# Altium footprint library Connectors.PCBLIB: 109 footprints (part 5 of 7)
Each footprint in its own frame and in the unit in brackets; x right, y up, seen from the top. Pads: shape width x height; smd on the part's side, far side on the other; paste and mask are expansions set on the pad; w line width, h text height; cw(c..) or ccw(c..) is an arc to the next point about the centre after c.
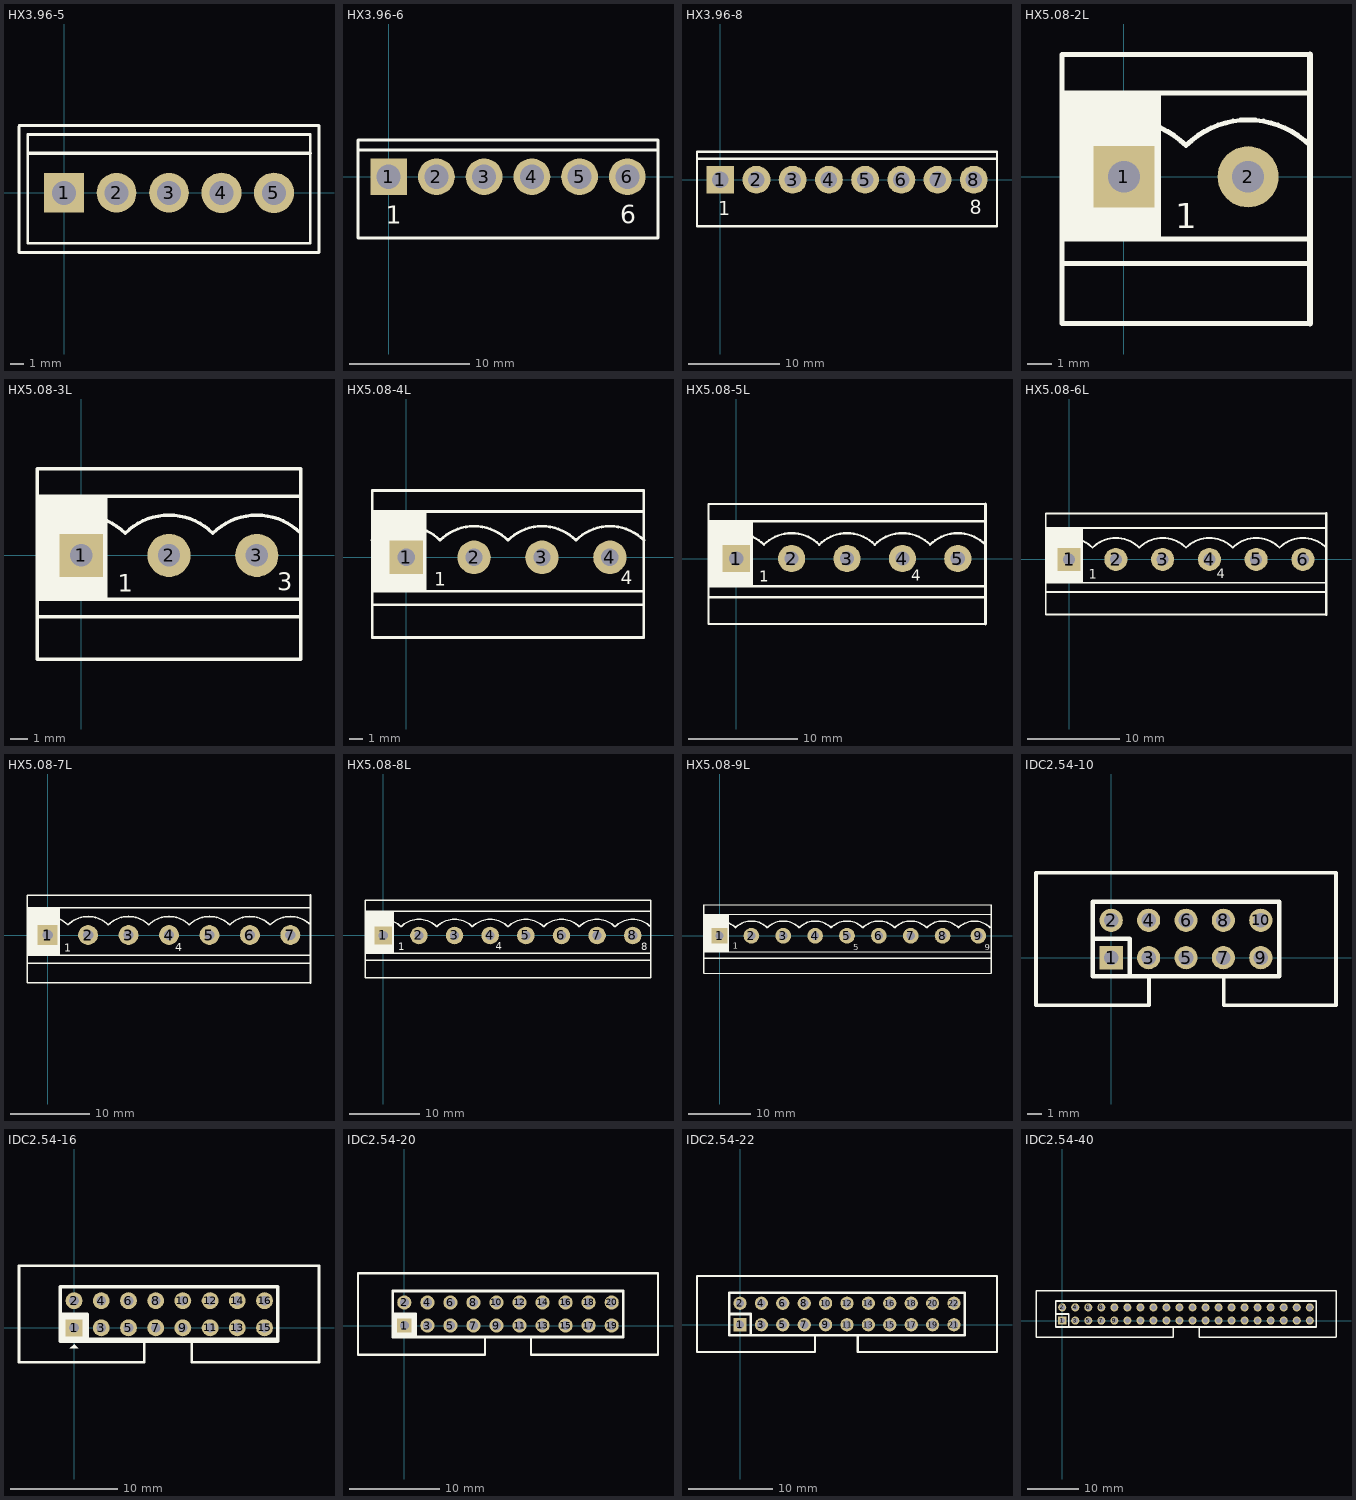
[diagram p4: the footprints below, top view; thin cyan lines are the x and y axes]

## HX3.96-5 [mm]
pads (5):
  rect 3x3 hole 1.8: 1(0,0)
  round 3 hole 1.8: 2(3.96,0) 3(7.92,0)
  round 3.048 hole 1.8: 4(11.88,0) 5(15.84,0)
Top Overlay:
  lines w0.203: -3.4,-4.5 -3.4,5 ; -3.387,5.08 19.24,5.08 19.24,-4.445 ; -3.3,-4.5 19.24,-4.5 ; -2.75,-3.8 -2.75,4.4 18.59,4.4 18.59,-3.8 -2.75,-3.8
  lines w0.254: -2.7,3 18.59,3

## HX3.96-6 [mil]
pads (6):
  rect 120x120 hole 78.74: 1(0,0)
  round 120 hole 78.74: 2(155.91,0) 3(311.81,0) 4(467.72,0) 5(623.62,0) 6(779.53,0)
Top Overlay:
  lines w10: -100,88 879.53,88 ; -100,-200 879.53,-200 879.53,120 -100,120 -100,-200
  text "1" at -10,-153 h60
  text "6" at 757,-152 h60

## HX3.96-8 [mil]
pads (8):
  rect 120x120 hole 70.87: 1(0,0)
  round 120 hole 70.87: 2(155.91,0) 3(311.81,0) 4(467.72,0) 5(623.62,0) 6(779.53,0) 7(935.43,0) 8(1091.34,0)
Top Overlay:
  lines w10: -100,90 1191.34,90 ; -100,-200 -100,120 1191.34,120 1191.34,-200 -100,-200
  text "1" at -9,-152 h60
  text "8" at 1075,-149 h60

## HX5.08-2L [mm]
pads (2):
  rect 2.5x2.5 hole 1.3: 1(0,0)
  round 2.5 hole 1.3: 2(5.08,0)
Top Overlay:
  rectangle: -2.54,-2.54 1.524,3.429
  lines w0.203: -2.544,1.274 cw(c0,-1.27) 2.544,1.274 ; -2.54,-3.556 7.62,-3.556 ; -2.54,-2.54 7.62,-2.54 ; -2.54,3.429 7.62,3.429 ; 2.536,1.274 cw(c5.08,-1.27) 7.624,1.274 ; 7.62,-6 -2.54,-6 -2.54,5 7.62,5
  lines w0.254: 7.62,-6 7.62,5
  text "1" at 2.108,-2.108 h1.02
3D body "050-2.step": height 11, standoff -2, extent -2.5,-5.5 7.5,2.5

## HX5.08-3L [mm]
pads (3):
  rect 2.5x2.5 hole 1.3: 1(0,0)
  round 2.5 hole 1.3: 2(5.08,0) 3(10.16,0)
Top Overlay:
  rectangle: -2.54,-2.54 1.524,3.429
  lines w0.203: -2.544,1.274 cw(c0,-1.27) 2.544,1.274 ; -2.54,-3.556 12.7,-3.556 ; -2.54,-2.54 12.7,-2.54 ; -2.54,3.429 12.7,3.429 ; 2.536,1.274 cw(c5.08,-1.27) 7.624,1.274 ; 7.616,1.274 cw(c10.16,-1.27) 12.704,1.274 ; -2.54,-6 -2.54,5 12.7,5 12.7,-6 -2.54,-6
  text "1" at 2.108,-2.108 h1.02
  text "3" at 11.328,-2.032 h1.02
3D body "050-3.step": height 11, standoff -2, extent -2.5,-5.5 12.5,2.5

## HX5.08-4L [mm]
pads (4):
  rect 2.5x2.5 hole 1.3: 1(0,0)
  round 2.5 hole 1.3: 2(5.08,0) 3(10.16,0) 4(15.24,0)
Top Overlay:
  rectangle: -2.54,-2.54 1.524,3.429
  lines w0.203: -2.544,1.274 cw(c0,-1.27) 2.544,1.274 ; -2.54,-3.556 17.78,-3.556 ; -2.54,-2.54 17.78,-2.54 ; -2.54,3.429 17.78,3.429 ; 2.536,1.274 cw(c5.08,-1.27) 7.624,1.274 ; 7.616,1.274 cw(c10.16,-1.27) 12.704,1.274 ; 12.696,1.274 cw(c15.24,-1.27) 17.784,1.274 ; -2.54,-6 17.78,-6 17.78,5 -2.54,5 -2.54,-6
  text "4" at 16.053,-2.032 h1.02
  text "1" at 2.108,-2.108 h1.02
3D body "050-4.step": height 11, standoff -2, extent -2.5,-5.5 17.5,2.5

## HX5.08-5L [mm]
pads (5):
  rect 2.5x2.5 hole 1.3: 1(0,0)
  round 2.5 hole 1.3: 2(5.08,0) 3(10.16,0) 4(15.24,0) 5(20.32,0)
Top Overlay:
  rectangle: -2.54,-2.54 1.524,3.429
  lines w0.203: -2.544,1.274 cw(c0,-1.27) 2.544,1.274 ; -2.54,-3.556 22.86,-3.556 ; -2.54,-2.54 22.86,-2.54 ; -2.54,3.429 22.86,3.429 ; 2.536,1.274 cw(c5.08,-1.27) 7.624,1.274 ; 7.616,1.274 cw(c10.16,-1.27) 12.704,1.274 ; 12.696,1.274 cw(c15.24,-1.27) 17.784,1.274 ; 17.776,1.274 cw(c20.32,-1.27) 22.864,1.274 ; 22.86,-6 -2.54,-6 -2.54,5 22.86,5
  lines w0.254: 22.86,-6 22.86,5
  text "1" at 2.108,-2.108 h1.02
  text "4" at 16.053,-2.032 h1.02
3D body "050-5.step": height 11, standoff -2, extent -2.5,-5.5 22.5,2.5

## HX5.08-6L [mm]
pads (6):
  rect 2.5x2.5 hole 1.3: 1(0,0)
  round 2.5 hole 1.3: 2(5.08,0) 3(10.16,0) 4(15.24,0) 5(20.32,0) 6(25.4,0)
Top Overlay:
  rectangle: -2.54,-2.54 1.524,3.429
  lines w0.203: -2.544,1.274 cw(c0,-1.27) 2.544,1.274 ; -2.54,-3.556 27.94,-3.556 ; -2.54,-2.54 27.94,-2.54 ; -2.54,3.429 27.94,3.429 ; 2.536,1.274 cw(c5.08,-1.27) 7.624,1.274 ; 7.616,1.274 cw(c10.16,-1.27) 12.704,1.274 ; 12.696,1.274 cw(c15.24,-1.27) 17.784,1.274 ; 17.776,1.274 cw(c20.32,-1.27) 22.864,1.274 ; 22.856,1.274 cw(c25.4,-1.27) 27.944,1.274 ; 27.94,-6 -2.54,-6 -2.54,5 27.94,5
  lines w0.254: 27.94,-6 27.94,5
  text "1" at 2.108,-2.108 h1.02
  text "4" at 16.053,-2.032 h1.02
3D body "050-6.step": height 11, standoff -2, extent -2.5,-5.5 27.5,2.5

## HX5.08-7L [mm]
pads (7):
  rect 2.5x2.5 hole 1.3: 1(0,0)
  round 2.5 hole 1.3: 2(5.08,0) 3(10.16,0) 4(15.24,0) 5(20.32,0) 6(25.4,0) 7(30.48,0)
Top Overlay:
  rectangle: -2.54,-2.54 1.524,3.429
  lines w0.203: -2.544,1.274 cw(c0,-1.27) 2.544,1.274 ; -2.54,-3.556 33.02,-3.556 ; -2.54,-2.54 33.02,-2.54 ; -2.54,3.429 33.02,3.429 ; 2.536,1.274 cw(c5.08,-1.27) 7.624,1.274 ; 7.616,1.274 cw(c10.16,-1.27) 12.704,1.274 ; 12.696,1.274 cw(c15.24,-1.27) 17.784,1.274 ; 17.776,1.274 cw(c20.32,-1.27) 22.864,1.274 ; 22.856,1.274 cw(c25.4,-1.27) 27.944,1.274 ; 27.936,1.274 cw(c30.48,-1.27) 33.024,1.274 ; 33.02,-6 -2.54,-6 -2.54,5 33.02,5
  lines w0.254: 33.02,-6 33.02,5
  text "1" at 2.108,-2.108 h1.02
  text "4" at 16.053,-2.032 h1.02
3D body "050-7.step": height 11, standoff -2, extent -2.5,-5.5 32.5,2.5

## HX5.08-8L [mm]
pads (8):
  rect 2.5x2.5 hole 1.3: 1(0,0)
  round 2.5 hole 1.3: 2(5.08,0) 3(10.16,0) 4(15.24,0) 5(20.32,0) 6(25.4,0) 7(30.48,0) 8(35.56,0)
Top Overlay:
  rectangle: -2.54,-2.54 1.524,3.429
  lines w0.203: -2.544,1.274 cw(c0,-1.27) 2.544,1.274 ; -2.54,-3.556 38.1,-3.556 ; -2.54,-2.54 38.1,-2.54 ; -2.54,3.429 38.1,3.429 ; 2.536,1.274 cw(c5.08,-1.27) 7.624,1.274 ; 7.616,1.274 cw(c10.16,-1.27) 12.704,1.274 ; 12.696,1.274 cw(c15.24,-1.27) 17.784,1.274 ; 17.776,1.274 cw(c20.32,-1.27) 22.864,1.274 ; 22.856,1.274 cw(c25.4,-1.27) 27.944,1.274 ; 27.936,1.274 cw(c30.48,-1.27) 33.024,1.274 ; 33.016,1.274 cw(c35.56,-1.27) 38.104,1.274 ; -2.54,-6 -2.54,5 38.1,5 38.1,-6 -2.54,-6
  text "1" at 2.108,-2.108 h1.02
  text "4" at 16.053,-2.032 h1.02
  text "8" at 36.779,-2.083 h1.02
3D body "050-8.step": height 11, standoff -2, extent -2.5,-5.5 37.5,2.5

## HX5.08-9L [mm]
pads (9):
  rect 2.5x2.5 hole 1.3: 1(0,0)
  round 2.5 hole 1.3: 2(5.08,0) 3(10.16,0) 4(15.24,0) 5(20.32,0) 6(25.4,0) 7(30.48,0) 8(35.56,0) 9(41.275,0)
Top Overlay:
  rectangle: -2.54,-2.54 1.524,3.429
  lines w0.154: -2.54,-6 43.276,-6 43.307,-5.969 ; -2.54,-2.54 43.307,-2.54 ; -2.54,3.429 43.307,3.429 ; -2.54,4.953 43.307,4.953
  lines w0.203: -2.544,1.274 cw(c0,-1.27) 2.544,1.274 ; -2.54,-6 -2.54,4.953 ; -2.54,-3.556 43.307,-3.556 ; 2.536,1.274 cw(c5.08,-1.27) 7.624,1.274 ; 7.616,1.274 cw(c10.16,-1.27) 12.704,1.274 ; 12.696,1.274 cw(c15.24,-1.27) 17.784,1.274 ; 17.776,1.274 cw(c20.32,-1.27) 22.864,1.274 ; 22.856,1.274 cw(c25.4,-1.27) 27.944,1.274 ; 27.936,1.274 cw(c30.48,-1.27) 33.024,1.274 ; 33.016,1.274 cw(c35.56,-1.27) 38.104,1.274 ; 38.1,1.27 cw(c40.644,-1.274) 43.189,1.27 ; 43.307,-5.969 43.307,4.953
  text "5" at 21.336,-2.286 h1.02
  text "1" at 2.108,-2.108 h1.02
  text "9" at 42.291,-2.286 h1.02
3D body "050-9.STEP": height 11, standoff -2, extent -2.5,-5.5 42.5,2.5

## IDC2.54-10 [mil]
pads (10):
  rect 62x62 hole 39.37: 1(0,0)
  round 62 hole 39.37: 2(0,100) 3(100,0) 4(100,100) 5(200,0) 6(200,100) 7(300,0) 8(300,100) 9(400,0) 10(400,100)
Top Overlay:
  lines w10: 101,-50 101,-127.17 -201.18,-127.17 -201.18,227.16 601.18,227.16 ; 301,-50 301,-127.17 601.18,-127.17 ; 601,-127.33 601,227
  lines w12: -50,50 50,50 50,-50 ; -50,-50 450,-50 450,150 -50,150 -50,-50
3D body "SW3dPS-HDB-10.STEP": height 366.14, standoff -98.43, extent -196.64,-128.08 598.64,242

## IDC2.54-16 [mil]
pads (16):
  rect 62x62 hole 35.43: 1(0,0)
  round 62 hole 35.43: 2(0,100) 3(100,0) 4(100,100) 5(200,0) 6(200,100) 7(300,0) 8(300,100) 9(400,0) 10(400,100) 11(500,0) 12(500,100) 13(600,0) 14(600,100) 15(700,0) 16(700,100)
Top Overlay:
  rectangle: -51,-49 48,53
  region: -15,-75 15,-75 0,-60
  lines w7.87: -50,-40 750,-40
  lines w10: 258,-49 258,-126.17 -202.18,-126.17 -202.18,228.16 900.18,228.16 900.18,-126.17 433,-126.17 433,-49
  lines w12: -51,51 49,51 49,-49 ; -51,-49 749,-49 749,151 -51,151 -51,-49

## IDC2.54-20 [mil]
pads (20):
  rect 62x62 hole 39.37: 1(0,0)
  round 62 hole 39.37: 2(0,100) 3(100,0) 4(100,100) 5(200,0) 6(200,100) 7(300,0) 8(300,100) 9(400,0) 10(400,100) 11(500,0) 12(500,100) 13(600,0) 14(600,100) 15(700,0) 16(700,100) 17(800,0) 18(800,100) 19(900,0) 20(900,100)
Top Overlay:
  rectangle: -50,-50 49,52
  lines w10: 350,-50 350,-127.17 -201.18,-127.17 -201.18,227.16 1101.18,227.16 1101.18,-127.17 550,-127.17 550,-50
  lines w12: -50,50 50,50 50,-50 ; -50,-50 950,-50 950,150 -50,150 -50,-50
3D body "SW3dPS-BH-20.STEP": height 352.36, standoff -114.17, extent -201,-123.27 1099,235

## IDC2.54-22 [mil]
pads (22):
  rect 62x62 hole 39.37: 1(0,0)
  round 62 hole 39.37: 2(0,100) 3(100,0) 4(100,100) 5(200,0) 6(200,100) 7(300,0) 8(300,100) 9(400,0) 10(400,100) 11(500,0) 12(500,100) 13(600,0) 14(600,100) 15(700,0) 16(700,100) 17(800,0) 18(800,100) 19(900,0) 20(900,100) 21(1000,0) 22(1000,100)
Top Overlay:
  lines w10: 350,-50 350,-127.17 -201.18,-127.17 -201.18,227.16 1201.18,227.16 1201.18,-127.17 550,-127.17 550,-50
  lines w12: -50,50 50,50 50,-50 ; -50,-50 -50,150 1050,150 1050,-50 -50,-50

## IDC2.54-40 [mil]
pads (40):
  rect 62x62 hole 39.37: 1(0,0)
  round 62 hole 39.37: 2(0,100) 3(100,0) 4(100,100) 5(200,0) 6(200,100) 7(300,0) 8(300,100) 9(400,0) 10(400,100) 11(500,0) 12(500,100) 13(600,0) 14(600,100) 15(700,0) 16(700,100) 17(800,0) 18(800,100) 19(900,0) 20(900,100) 21(1000,0) 22(1000,100) 23(1100,0) 24(1100,100) 25(1200,0) 26(1200,100) 27(1300,0) 28(1300,100) 29(1400,0) 30(1400,100) 31(1500,0) 32(1500,100) 33(1600,0) 34(1600,100) 35(1700,0) 36(1700,100) 37(1800,0) 38(1800,100) 39(1900,0) 40(1900,100)
Top Overlay:
  lines w10: 851,-50 851,-127.17 -201.18,-127.17 -201.18,227.16 2101.18,227.16 2101.18,-127.17 ; 1051,-50 1051,-127.17 2101,-127.17
  lines w12: -50,50 50,50 50,-50 ; 1948,-50 -50,-50 -50,150 1950,150 ; 1950,50 1950,-50 ; 1950,-50 1950,150 ; 1950,-50 1950,150
3D body "SW3dPS-HDB-40.STEP": height 366.14, standoff -98.43, extent -196.64,-126.08 2098.64,244